# Altium footprint library FPGAboard.PcbLib: 34 footprints (part 2 of 3)
Each footprint in its own frame and in the unit in brackets; x right, y up, seen from the top. Pads: shape width x height; smd on the part's side, far side on the other; paste and mask are expansions set on the pad; w line width, h text height; cw(c..) or ccw(c..) is an arc to the next point about the centre after c.
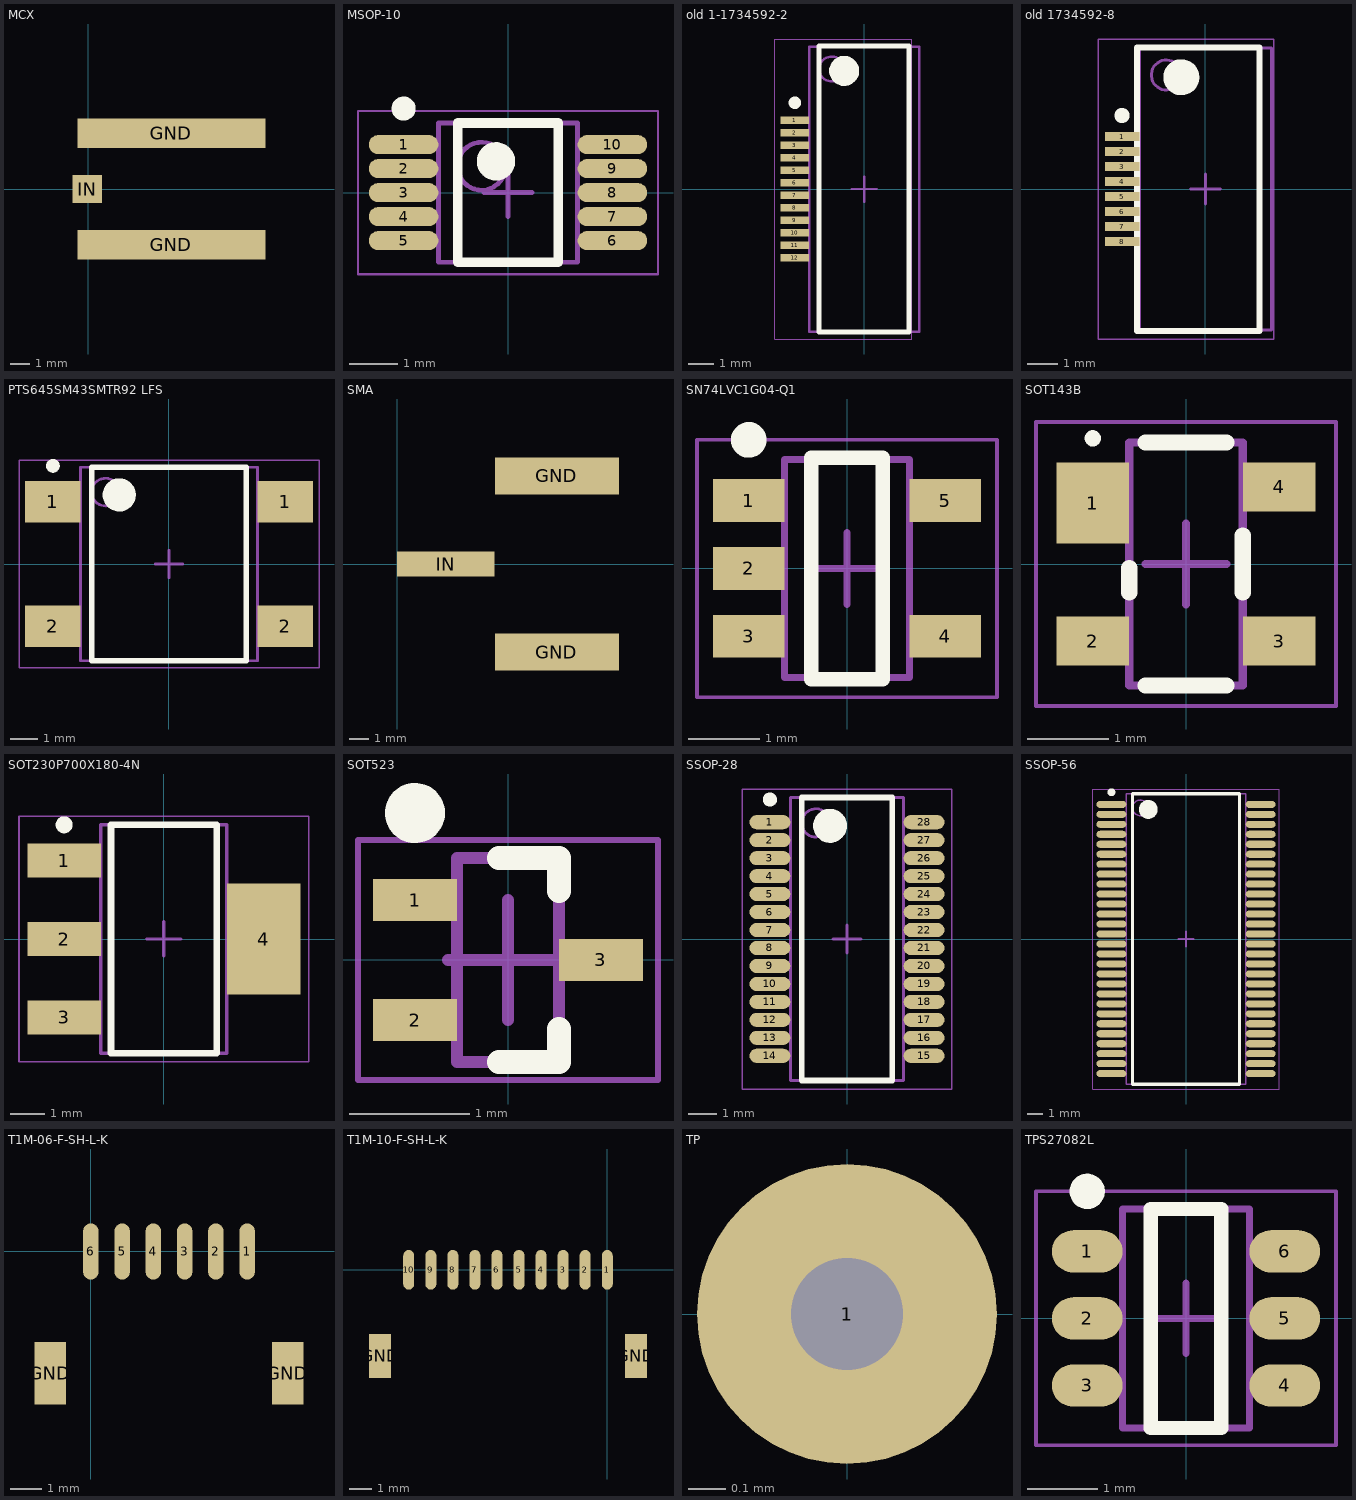
[diagram p1: the footprints below, top view; thin cyan lines are the x and y axes]

## MCX [mm] "CONN MCX RCPT STR 50OHM EDGE MNT"
pads (3):
  rect 9.6x1.5 smd: GND(4.25,-2.85) GND(4.25,2.85)
  rect 1.5x1.45 smd: IN(-0.05,0)
3D body "734151061.stp": height 3, standoff -2, extent -0.55,-3.346 8.746,3.346

## MSOP-10 [mm]
height 1.1
pads (10):
  oval 1.45x0.4 smd: 1(-2.175,1) 2(-2.175,0.5) 3(-2.175,0) 4(-2.175,-0.5) 5(-2.175,-1) 6(2.175,-1) 7(2.175,-0.5) 8(2.175,0) 9(2.175,0.5) 10(2.175,1)
Top Overlay:
  circle w0.4: c-0.25,0.65 r0.2
  circle w0.25: c-2.175,1.75 r0.125
  lines w0.2: -1.05,-1.45 1.05,-1.45 1.05,1.45 -1.05,1.45 -1.05,-1.45
Mechanical 13:
  circle w0.1: c-0.55,0.55 r0.5
  lines w0.1: -1.45,-1.45 1.45,-1.45 1.45,1.45 -1.45,1.45 -1.45,-1.45
Mechanical 15:
  lines w0.05: -3.125,-1.7 3.125,-1.7 3.125,1.7 -3.125,1.7 -3.125,-1.7
  lines w0.1: -0.5,0 0.5,0 ; 0,-0.5 0,0.5
3D body "MSOP-10.step": height 1.1, standoff 0, extent -2.45,-1.45 2.45,1.45

## old 1-1734592-2 [mm] "FPC-style ribbon connector"
height 2
pads (12):
  rect 1.15x0.3 smd: 1(-2.775,2.75) 2(-2.775,2.25) 3(-2.775,1.75) 4(-2.775,1.25) 5(-2.775,0.75) 6(-2.775,0.25) 7(-2.775,-0.25) 8(-2.775,-0.75) 9(-2.775,-1.25) 10(-2.775,-1.75) 11(-2.775,-2.25) 12(-2.775,-2.75)
Top Overlay:
  circle w0.6: c-0.8,4.725 r0.3
  circle w0.25: c-2.775,3.45 r0.125
  lines w0.2: -1.8,-5.725 1.8,-5.725 1.8,5.725 -1.8,5.725 -1.8,-5.725
Mechanical 13:
  circle w0.1: c-1.3,4.8 r0.5
  lines w0.1: -2.2,-5.7 2.2,-5.7 2.2,5.7 -2.2,5.7 -2.2,-5.7
Mechanical 15:
  lines w0.05: -3.575,-6 1.905,-6 1.905,6 -3.575,6 -3.575,-6
  lines w0.1: -0.5,0 0.5,0 ; 0,-0.5 0,0.5
3D body "c-1-1734592-2-c-3d.stp": height 2, standoff -0.05, extent -2.936,-5.715 2.174,5.715

## old 1734592-8 [mm]
height 2
pads (8):
  rect 1.15x0.3 smd: 1(-2.775,1.75) 2(-2.775,1.25) 3(-2.775,0.75) 4(-2.775,0.25) 5(-2.775,-0.25) 6(-2.775,-0.75) 7(-2.775,-1.25) 8(-2.775,-1.75)
Top Overlay:
  circle w0.25: c-2.775,2.45 r0.125
  circle w0.6: c-0.8,3.725 r0.3
  lines w0.2: -2.286,-4.725 -2.286,4.725 1.8,4.725 1.8,-4.725 -2.286,-4.725
Mechanical 13:
  circle w0.1: c-1.3,3.8 r0.5
  lines w0.1: -2.2,-4.7 -2.2,4.7 2.2,4.7 2.2,-4.7 -2.2,-4.7
Mechanical 15:
  lines w0.05: -3.575,-5 -3.575,5 2.286,5 2.286,-5 -3.575,-5
  lines w0.1: -0.5,0 0.5,0 ; 0,-0.5 0,0.5
3D body "c-1734592-8-c-3d.stp": height 2, standoff -0.05, extent -3.068,-4.715 2.042,4.715

## PTS645SM43SMTR92 LFS [mm]
height 4.3
pads (4):
  rect 2x1.5 smd: 1(-4.2,2.25) 1(4.2,2.25) 2(-4.2,-2.25) 2(4.2,-2.25)
Top Overlay:
  circle w0.6: c-1.8,2.5 r0.3
  circle w0.25: c-4.2,3.55 r0.125
  lines w0.2: -2.8,-3.5 2.8,-3.5 2.8,3.5 -2.8,3.5 -2.8,-3.5
Mechanical 13:
  circle w0.1: c-2.3,2.6 r0.5
  lines w0.1: -3.2,-3.5 3.2,-3.5 3.2,3.5 -3.2,3.5 -3.2,-3.5
Mechanical 15:
  lines w0.05: -5.425,-3.75 5.425,-3.75 5.425,3.75 -5.425,3.75 -5.425,-3.75
  lines w0.1: -0.5,0 0.5,0 ; 0,-0.5 0,0.5
3D body "PTS645SM43SMTR92 LFS.step": height 4.3, standoff 0, extent -4.743,-3.5 4.743,3.5

## SMA [mm] "Surface mount SMA"
height 2.946
pads (3):
  rect 6.35x1.91 smd: GND(8.2,-4.52) GND(8.2,4.52)
  rect 5x1.27 smd: IN(2.5,0)

## SN74LVC1G04-Q1 [mm] "SOT23, 5-Leads, Body 2.90x2.80mm, Pitch 0.95mm, IPC Medium Density"
height 1.45
pads (5):
  rect 1x0.6 smd: 1(-1.375,0.95) 2(-1.375,0) 3(-1.375,-0.95) 4(1.375,-0.95) 5(1.375,0.95)
Top Overlay:
  circle w0.25: c-1.375,1.8 r0.125
  lines w0.2: -0.5,-1.55 -0.5,1.55 0.5,1.55 0.5,-1.55 -0.5,-1.55
Mechanical 13:
  lines w0.1: -0.875,-1.525 0.875,-1.525 0.875,1.525 -0.875,1.525 -0.875,-1.525
Mechanical 15:
  lines w0.05: -2.1,-1.8 2.1,-1.8 2.1,1.8 -2.1,1.8 -2.1,-1.8
  lines w0.1: -0.5,0 0.5,0 ; 0,-0.5 0,0.5
3D body "SN74LVC1G04-Q1.step": height 1.45, standoff 0, extent -1.5,-1.525 1.5,1.525

## SOT143B [mm] "SOT143, 4-Leads, Body 2.90x2.30mm, Pitch 1.90mm, IPC Medium Density"
height 1.1
pads (4):
  rect 0.9x1 smd: 1(-1.15,0.75)
  rect 0.9x0.6 smd: 2(-1.15,-0.95) 3(1.15,-0.95) 4(1.15,0.95)
Top Overlay:
  circle w0.1: c-1.15,1.55 r0.05
  lines w0.2: -0.7,-0.35 -0.7,-0.05 ; -0.5,-1.5 0.5,-1.5 ; -0.5,1.5 0.5,1.5 ; 0.7,-0.35 0.7,0.35
Mechanical 13:
  lines w0.1: -0.7,-1.5 -0.7,1.5 0.7,1.5 0.7,-1.5 -0.7,-1.5
Mechanical 15:
  lines w0.05: -1.85,-1.75 -1.85,1.75 1.85,1.75 1.85,-1.75 -1.85,-1.75
  lines w0.1: -0.5,0 0.5,0 ; 0,-0.5 0,0.5
3D body "SOT143B.step": height 1.1, standoff 0, extent -1.15,-1.5 1.15,1.5

## SOT230P700X180-4N [mm] "SOT223, 4-Leads, Body 6.50x7.00mm (avg), Pitch 2.30mm, IPC Medium Density"
height 1.8
pads (4):
  rect 2.15x1 smd: 1(-2.925,2.3) 2(-2.925,0) 3(-2.925,-2.3)
  rect 2.15x3.25 smd: 4(2.925,0)
Top Overlay:
  circle w0.25: c-2.925,3.35 r0.125
  lines w0.2: -1.55,-3.35 -1.55,3.35 1.55,3.35 1.55,-3.35 -1.55,-3.35
Mechanical 13:
  lines w0.1: -1.85,-3.35 -1.85,3.35 1.85,3.35 1.85,-3.35 -1.85,-3.35
Mechanical 15:
  lines w0.05: -4.25,-3.6 -4.25,3.6 4.25,3.6 4.25,-3.6 -4.25,-3.6
  lines w0.1: -0.5,0 0.5,0 ; 0,-0.5 0,0.5
3D body "SOT230P700X180-4N.step": height 1.8, standoff 0, extent -3.5,-3.35 3.5,3.35

## SOT523 [mm]
height 0.9
pads (3):
  rect 0.7x0.35 smd: 1(-0.775,0.5) 2(-0.775,-0.5) 3(0.775,0)
Top Overlay:
  circle w0.25: c-0.775,1.225 r0.125
  lines w0.2: -0.075,-0.85 0.425,-0.85 0.425,-0.575 ; -0.075,0.85 0.425,0.85 0.425,0.575
Mechanical 13:
  lines w0.1: -0.425,-0.85 -0.425,0.85 0.425,0.85 0.425,-0.85 -0.425,-0.85
Mechanical 15:
  lines w0.05: -1.25,-1 -1.25,1 1.25,1 1.25,-1 -1.25,-1
  lines w0.1: -0.5,0 0.5,0 ; 0,-0.5 0,0.5
3D body "SOT523.step": height 0.9, standoff 0, extent -0.8,-0.848 0.8,0.848

## SSOP-28 [mm]
height 1.73
pads (28):
  oval 1.45x0.5 smd: 1(-2.725,4.127) 2(-2.725,3.492) 3(-2.725,2.857) 4(-2.725,2.222) 5(-2.725,1.587) 6(-2.725,0.953) 7(-2.725,0.318) 8(-2.725,-0.318) 9(-2.725,-0.953) 10(-2.725,-1.587) 11(-2.725,-2.222) 12(-2.725,-2.857) 13(-2.725,-3.492) 14(-2.725,-4.127) 15(2.725,-4.127) 16(2.725,-3.492) 17(2.725,-2.857) 18(2.725,-2.222) 19(2.725,-1.587) 20(2.725,-0.953) 21(2.725,-0.318) 22(2.725,0.318) 23(2.725,0.953) 24(2.725,1.587) 25(2.725,2.222) 26(2.725,2.857) 27(2.725,3.492) 28(2.725,4.127)
Top Overlay:
  circle w0.25: c-2.725,4.928 r0.125
  circle w0.6: c-0.6,4 r0.3
  lines w0.2: -1.6,-5 -1.6,5 1.6,5 1.6,-5 -1.6,-5
Mechanical 13:
  circle w0.1: c-1.1,4.1 r0.5
  lines w0.1: -2,-5 -2,5 2,5 2,-5 -2,-5
Mechanical 15:
  lines w0.05: -3.7,-5.3 -3.7,5.3 3.7,5.3 3.7,-5.3 -3.7,-5.3
  lines w0.1: -0.5,0 0.5,0 ; 0,-0.5 0,0.5
3D body "SSOP-28b.step": height 1.73, standoff 0, extent -2.997,-5 2.997,5

## SSOP-56 [mm]
height 2.8
pads (56):
  oval 1.9x0.45 smd: 1(-4.75,8.572) 2(-4.75,7.938) 3(-4.75,7.302) 4(-4.75,6.667) 5(-4.75,6.032) 6(-4.75,5.397) 7(-4.75,4.763) 8(-4.75,4.127) 9(-4.75,3.492) 10(-4.75,2.857) 11(-4.75,2.222) 12(-4.75,1.587) 13(-4.75,0.953) 14(-4.75,0.318) 15(-4.75,-0.318) 16(-4.75,-0.953) 17(-4.75,-1.587) 18(-4.75,-2.222) 19(-4.75,-2.857) 20(-4.75,-3.492) 21(-4.75,-4.127) 22(-4.75,-4.763) 23(-4.75,-5.397) 24(-4.75,-6.032) 25(-4.75,-6.667) 26(-4.75,-7.302) 27(-4.75,-7.938) 28(-4.75,-8.572) 29(4.75,-8.572) 30(4.75,-7.938) 31(4.75,-7.302) 32(4.75,-6.667) 33(4.75,-6.032) 34(4.75,-5.397) 35(4.75,-4.763) 36(4.75,-4.127) 37(4.75,-3.492) 38(4.75,-2.857) 39(4.75,-2.222) 40(4.75,-1.587) 41(4.75,-0.953) 42(4.75,-0.318) 43(4.75,0.318) 44(4.75,0.953) 45(4.75,1.587) 46(4.75,2.222) 47(4.75,2.857) 48(4.75,3.492) 49(4.75,4.127) 50(4.75,4.763) 51(4.75,5.397) 52(4.75,6.032) 53(4.75,6.667) 54(4.75,7.302) 55(4.75,7.938) 56(4.75,8.572)
Top Overlay:
  circle w0.6: c-2.4,8.25 r0.3
  circle w0.25: c-4.75,9.347 r0.125
  lines w0.2: -3.4,-9.25 3.4,-9.25 3.4,9.25 -3.4,9.25 -3.4,-9.25
Mechanical 13:
  circle w0.1: c-2.9,8.35 r0.5
  lines w0.1: -3.8,-9.25 3.8,-9.25 3.8,9.25 -3.8,9.25 -3.8,-9.25
Mechanical 15:
  lines w0.05: -5.95,-9.55 5.95,-9.55 5.95,9.55 -5.95,9.55 -5.95,-9.55
  lines w0.1: -0.5,0 0.5,0 ; 0,-0.5 0,0.5
3D body "SSOP-56.step": height 2.79, standoff 0, extent -5.175,-9.25 5.175,9.25

## T1M-06-F-SH-L-K [mm]
pads (8):
  oval 0.5x1.8 smd: 1(5,0) 2(4,0) 3(3,0) 4(2,0) 5(1,0) 6(0,0)
  rect 1x2 smd: GND(-1.3,-3.9) GND(6.3,-3.9)
3D body "T1M-06-F-SH-L-K.stp": height 4.72, standoff 0, extent -1.7,-5.475 6.7,0.425

## T1M-10-F-SH-L-K [mm]
pads (12):
  oval 0.5x1.8 smd: 1(0,0) 2(-1,0) 3(-2,0) 4(-3,0) 5(-4,0) 6(-5,0) 7(-6,0) 8(-7,0) 9(-8,0) 10(-9,0)
  rect 1x2 smd: GND(-10.3,-3.9) GND(1.3,-3.9)
3D body "T1M-10-F-SH-L-K.stp": height 4.7, standoff -0.02, extent -10.7,-5.475 1.7,0.425

## TP [mm] "Test point"
pads (1):
  round 0.8 hole 0.3: 1(0,0)

## TPS27082L [mm]
height 1.1
pads (6):
  oval 1x0.6 smd: 1(-1.4,0.95) 2(-1.4,0) 3(-1.4,-0.95) 4(1.4,-0.95) 5(1.4,0) 6(1.4,0.95)
Top Overlay:
  circle w0.25: c-1.4,1.8 r0.125
  lines w0.2: -0.5,-1.55 0.5,-1.55 0.5,1.55 -0.5,1.55 -0.5,-1.55
Mechanical 13:
  lines w0.1: -0.9,-1.55 0.9,-1.55 0.9,1.55 -0.9,1.55 -0.9,-1.55
Mechanical 15:
  lines w0.05: -2.125,-1.8 2.125,-1.8 2.125,1.8 -2.125,1.8 -2.125,-1.8
  lines w0.1: -0.5,0 0.5,0 ; 0,-0.5 0,0.5
3D body "TPS27082L.step": height 1.1, standoff 0.01, extent -1.393,-1.55 1.393,1.55